# Altium footprint library Package_DFN_QFN.PcbLib: 557 footprints (part 21 of 35)
Each footprint in its own frame and in the unit in brackets; x right, y up, seen from the top. Pads: shape width x height; smd on the part's side, far side on the other; paste and mask are expansions set on the pad; w line width, h text height; cw(c..) or ccw(c..) is an arc to the next point about the centre after c.
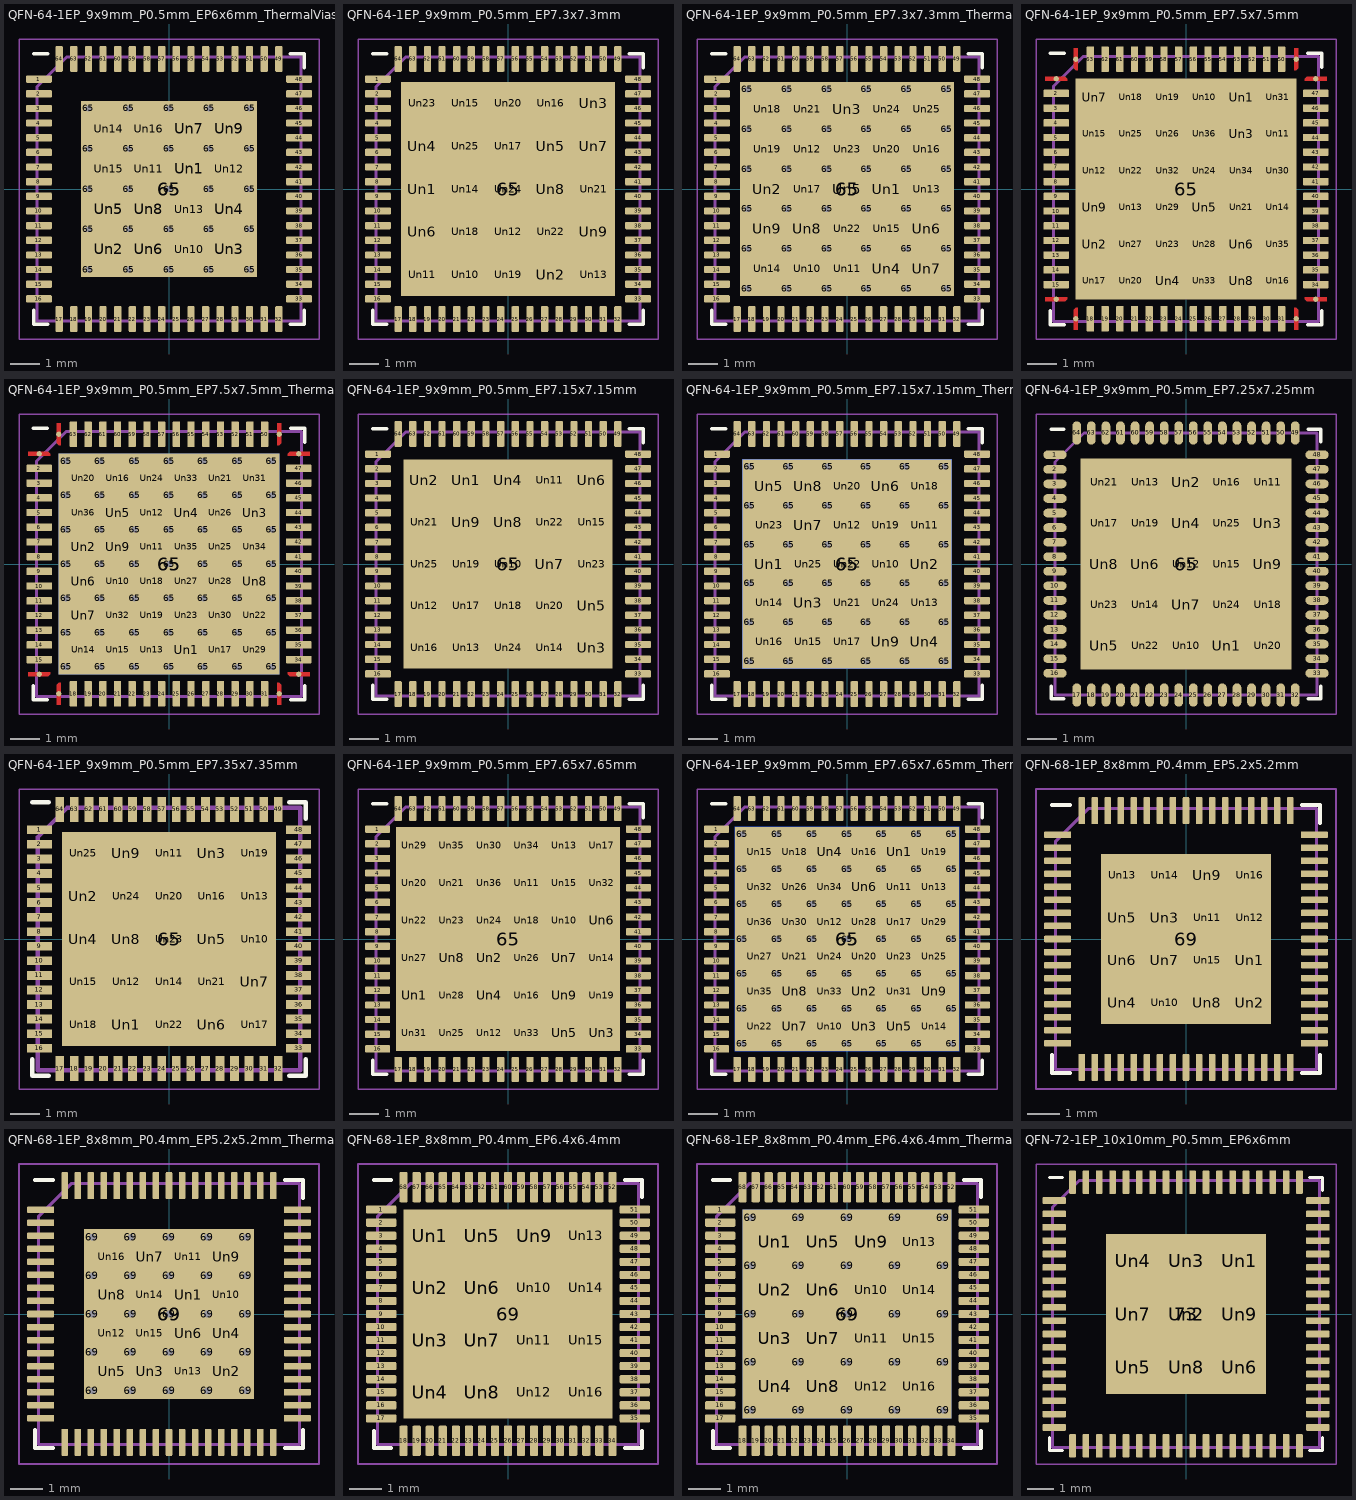
[diagram p20: the footprints below, top view; thin cyan lines are the x and y axes]

## QFN-64-1EP_9x9mm_P0.5mm_EP6x6mm_ThermalVias [mm]
pads (107):
  rrect25% 0.875x0.25 smd: 1(-4.437,3.75) 2(-4.437,3.25) 3(-4.437,2.75) 4(-4.437,2.25) 5(-4.437,1.75) 6(-4.437,1.25) 7(-4.437,0.75) 8(-4.437,0.25) 9(-4.437,-0.25) 10(-4.437,-0.75) 11(-4.437,-1.25) 12(-4.437,-1.75) 13(-4.437,-2.25) 14(-4.437,-2.75) 15(-4.437,-3.25) 16(-4.437,-3.75) 33(4.437,-3.75) 34(4.437,-3.25) 35(4.437,-2.75) 36(4.437,-2.25) 37(4.437,-1.75) 38(4.437,-1.25) 39(4.437,-0.75) 40(4.437,-0.25) 41(4.437,0.25) 42(4.437,0.75) 43(4.437,1.25) 44(4.437,1.75) 45(4.437,2.25) 46(4.437,2.75) 47(4.437,3.25) 48(4.437,3.75)
  rrect25% 0.25x0.875 smd: 17(-3.75,-4.437) 18(-3.25,-4.437) 19(-2.75,-4.437) 20(-2.25,-4.437) 21(-1.75,-4.437) 22(-1.25,-4.437) 23(-0.75,-4.437) 24(-0.25,-4.437) 25(0.25,-4.437) 26(0.75,-4.437) 27(1.25,-4.437) 28(1.75,-4.437) 29(2.25,-4.437) 30(2.75,-4.437) 31(3.25,-4.437) 32(3.75,-4.437) 49(3.75,4.437) 50(3.25,4.437) 51(2.75,4.437) 52(2.25,4.437) 53(1.75,4.437) 54(1.25,4.437) 55(0.75,4.437) 56(0.25,4.437) 57(-0.25,4.437) 58(-0.75,4.437) 59(-1.25,4.437) 60(-1.75,4.437) 61(-2.25,4.437) 62(-2.75,4.437) 63(-3.25,4.437) 64(-3.75,4.437)
  round 0.5 hole 0.2: 65(-2.75,-2.75) 65(-2.75,-1.375) 65(-2.75,0) 65(-2.75,1.375) 65(-2.75,2.75) 65(-1.375,-2.75) 65(-1.375,-1.375) 65(-1.375,0) 65(-1.375,1.375) 65(-1.375,2.75) 65(0,-2.75) 65(0,-1.375) 65(0,0) 65(0,1.375) 65(0,2.75) 65(1.375,-2.75) 65(1.375,-1.375) 65(1.375,0) 65(1.375,1.375) 65(1.375,2.75) 65(2.75,-2.75) 65(2.75,-1.375) 65(2.75,0) 65(2.75,1.375) 65(2.75,2.75)
  rect 6x6 smd far side: 65(0,0)
  rect 6x6 smd: 65(0,0)
  rrect21% 1.209x1.209 on Top Paste: Un1(0.687,0.687) Un2(-2.063,-2.063) Un3(2.063,-2.063) Un4(2.063,-0.687) Un5(-2.063,-0.687) Un6(-0.687,-2.063) Un7(0.687,2.063) Un8(-0.687,-0.687) Un9(2.063,2.063) Un10(0.687,-2.063) Un11(-0.687,0.687) Un12(2.063,0.687) Un13(0.687,-0.687) Un14(-2.063,2.063) Un15(-2.063,0.687) Un16(-0.687,2.063)
F.SilkS:
  lines w0.12: -4.61,-4.135 -4.61,-4.61 -4.135,-4.61 ; -4.61,4.61 -4.135,4.61 ; 4.135,-4.61 4.61,-4.61 4.61,-4.135 ; 4.135,4.61 4.61,4.61 4.61,4.135
F.CrtYd:
  lines w0.05: -5.12,-5.12 5.12,-5.12 5.12,5.12 -5.12,5.12 -5.12,-5.12
F.Fab:
  lines w0.1: -4.5,-4.5 -4.5,3.5 -3.5,4.5 4.5,4.5 4.5,-4.5 -4.5,-4.5
  text "'.Designator'" at -4.047,-0.84 h1

## QFN-64-1EP_9x9mm_P0.5mm_EP7.3x7.3mm [mm]
pads (90):
  rrect25% 0.875x0.25 smd: 1(-4.437,3.75) 2(-4.437,3.25) 3(-4.437,2.75) 4(-4.437,2.25) 5(-4.437,1.75) 6(-4.437,1.25) 7(-4.437,0.75) 8(-4.437,0.25) 9(-4.437,-0.25) 10(-4.437,-0.75) 11(-4.437,-1.25) 12(-4.437,-1.75) 13(-4.437,-2.25) 14(-4.437,-2.75) 15(-4.437,-3.25) 16(-4.437,-3.75) 33(4.437,-3.75) 34(4.437,-3.25) 35(4.437,-2.75) 36(4.437,-2.25) 37(4.437,-1.75) 38(4.437,-1.25) 39(4.437,-0.75) 40(4.437,-0.25) 41(4.437,0.25) 42(4.437,0.75) 43(4.437,1.25) 44(4.437,1.75) 45(4.437,2.25) 46(4.437,2.75) 47(4.437,3.25) 48(4.437,3.75)
  rrect25% 0.25x0.875 smd: 17(-3.75,-4.437) 18(-3.25,-4.437) 19(-2.75,-4.437) 20(-2.25,-4.437) 21(-1.75,-4.437) 22(-1.25,-4.437) 23(-0.75,-4.437) 24(-0.25,-4.437) 25(0.25,-4.437) 26(0.75,-4.437) 27(1.25,-4.437) 28(1.75,-4.437) 29(2.25,-4.437) 30(2.75,-4.437) 31(3.25,-4.437) 32(3.75,-4.437) 49(3.75,4.437) 50(3.25,4.437) 51(2.75,4.437) 52(2.25,4.437) 53(1.75,4.437) 54(1.25,4.437) 55(0.75,4.437) 56(0.25,4.437) 57(-0.25,4.437) 58(-0.75,4.437) 59(-1.25,4.437) 60(-1.75,4.437) 61(-2.25,4.437) 62(-2.75,4.437) 63(-3.25,4.437) 64(-3.75,4.437)
  rect 7.3x7.3 smd: 65(0,0)
  rrect21% 1.18x1.18 on Top Paste: Un1(-2.92,0) Un2(1.46,-2.92) Un3(2.92,2.92) Un4(-2.92,1.46) Un5(1.46,1.46) Un6(-2.92,-1.46) Un7(2.92,1.46) Un8(1.46,0) Un9(2.92,-1.46) Un10(-1.46,-2.92) Un11(-2.92,-2.92) Un12(0,-1.46) Un13(2.92,-2.92) Un14(-1.46,0) Un15(-1.46,2.92) Un16(1.46,2.92) Un17(0,1.46) Un18(-1.46,-1.46) Un19(0,-2.92) Un20(0,2.92) Un21(2.92,0) Un22(1.46,-1.46) Un23(-2.92,2.92) Un24(0,0) Un25(-1.46,1.46)
F.SilkS:
  lines w0.12: -4.61,-4.135 -4.61,-4.61 -4.135,-4.61 ; -4.61,4.61 -4.135,4.61 ; 4.135,-4.61 4.61,-4.61 4.61,-4.135 ; 4.135,4.61 4.61,4.61 4.61,4.135
F.CrtYd:
  lines w0.05: -5.12,-5.12 -5.12,5.12 5.12,5.12 5.12,-5.12 -5.12,-5.12
F.Fab:
  lines w0.1: -4.5,-4.5 -4.5,3.5 -3.5,4.5 4.5,4.5 4.5,-4.5 -4.5,-4.5
  text "'.Designator'" at -4.047,-0.84 h1

## QFN-64-1EP_9x9mm_P0.5mm_EP7.3x7.3mm_ThermalVias [mm]
pads (127):
  rrect25% 0.875x0.25 smd: 1(-4.437,3.75) 2(-4.437,3.25) 3(-4.437,2.75) 4(-4.437,2.25) 5(-4.437,1.75) 6(-4.437,1.25) 7(-4.437,0.75) 8(-4.437,0.25) 9(-4.437,-0.25) 10(-4.437,-0.75) 11(-4.437,-1.25) 12(-4.437,-1.75) 13(-4.437,-2.25) 14(-4.437,-2.75) 15(-4.437,-3.25) 16(-4.437,-3.75) 33(4.437,-3.75) 34(4.437,-3.25) 35(4.437,-2.75) 36(4.437,-2.25) 37(4.437,-1.75) 38(4.437,-1.25) 39(4.437,-0.75) 40(4.437,-0.25) 41(4.437,0.25) 42(4.437,0.75) 43(4.437,1.25) 44(4.437,1.75) 45(4.437,2.25) 46(4.437,2.75) 47(4.437,3.25) 48(4.437,3.75)
  rrect25% 0.25x0.875 smd: 17(-3.75,-4.437) 18(-3.25,-4.437) 19(-2.75,-4.437) 20(-2.25,-4.437) 21(-1.75,-4.437) 22(-1.25,-4.437) 23(-0.75,-4.437) 24(-0.25,-4.437) 25(0.25,-4.437) 26(0.75,-4.437) 27(1.25,-4.437) 28(1.75,-4.437) 29(2.25,-4.437) 30(2.75,-4.437) 31(3.25,-4.437) 32(3.75,-4.437) 49(3.75,4.437) 50(3.25,4.437) 51(2.75,4.437) 52(2.25,4.437) 53(1.75,4.437) 54(1.25,4.437) 55(0.75,4.437) 56(0.25,4.437) 57(-0.25,4.437) 58(-0.75,4.437) 59(-1.25,4.437) 60(-1.75,4.437) 61(-2.25,4.437) 62(-2.75,4.437) 63(-3.25,4.437) 64(-3.75,4.437)
  round 0.5 hole 0.2: 65(-3.4,-3.4) 65(-3.4,-2.04) 65(-3.4,-0.68) 65(-3.4,0.68) 65(-3.4,2.04) 65(-3.4,3.4) 65(-2.04,-3.4) 65(-2.04,-2.04) 65(-2.04,-0.68) 65(-2.04,0.68) 65(-2.04,2.04) 65(-2.04,3.4) 65(-0.68,-3.4) 65(-0.68,-2.04) 65(-0.68,-0.68) 65(-0.68,0.68) 65(-0.68,2.04) 65(-0.68,3.4) 65(0.68,-3.4) 65(0.68,-2.04) 65(0.68,-0.68) 65(0.68,0.68) 65(0.68,2.04) 65(0.68,3.4) 65(2.04,-3.4) 65(2.04,-2.04) 65(2.04,-0.68) 65(2.04,0.68) 65(2.04,2.04) 65(2.04,3.4) 65(3.4,-3.4) 65(3.4,-2.04) 65(3.4,-0.68) 65(3.4,0.68) 65(3.4,2.04) 65(3.4,3.4)
  rect 7.3x7.3 smd: 65(0,0)
  rect 7.3x7.3 smd far side: 65(0,0)
  rrect21% 1.177x1.177 on Top Paste: Un1(1.36,0) Un2(-2.72,0) Un3(0,2.72) Un4(1.36,-2.72) Un5(0,0) Un6(2.72,-1.36) Un7(2.72,-2.72) Un8(-1.36,-1.36) Un9(-2.72,-1.36) Un10(-1.36,-2.72) Un11(0,-2.72) Un12(-1.36,1.36) Un13(2.72,0) Un14(-2.72,-2.72) Un15(1.36,-1.36) Un16(2.72,1.36) Un17(-1.36,0) Un18(-2.72,2.72) Un19(-2.72,1.36) Un20(1.36,1.36) Un21(-1.36,2.72) Un22(0,-1.36) Un23(0,1.36) Un24(1.36,2.72) Un25(2.72,2.72)
F.SilkS:
  lines w0.12: -4.61,-4.135 -4.61,-4.61 -4.135,-4.61 ; -4.61,4.61 -4.135,4.61 ; 4.135,-4.61 4.61,-4.61 4.61,-4.135 ; 4.135,4.61 4.61,4.61 4.61,4.135
F.CrtYd:
  lines w0.05: -5.12,-5.12 5.12,-5.12 5.12,5.12 -5.12,5.12 -5.12,-5.12
F.Fab:
  lines w0.1: -4.5,-4.5 4.5,-4.5 4.5,4.5 -3.5,4.5 -4.5,3.5 -4.5,-4.5
  text "'.Designator'" at -4.047,-0.84 h1

## QFN-64-1EP_9x9mm_P0.5mm_EP7.5x7.5mm [mm]
pads (101):
  round 0.179 smd: 1(-4.413,3.75) 16(-4.413,-3.75) 17(-3.75,-4.413) 32(3.75,-4.413) 33(4.413,-3.75) 48(4.413,3.75) 49(3.75,4.413) 64(-3.75,4.413)
  rrect25% 0.875x0.25 smd: 2(-4.413,3.25) 3(-4.413,2.75) 4(-4.413,2.25) 5(-4.413,1.75) 6(-4.413,1.25) 7(-4.413,0.75) 8(-4.413,0.25) 9(-4.413,-0.25) 10(-4.413,-0.75) 11(-4.413,-1.25) 12(-4.413,-1.75) 13(-4.413,-2.25) 14(-4.413,-2.75) 15(-4.413,-3.25) 34(4.413,-3.25) 35(4.413,-2.75) 36(4.413,-2.25) 37(4.413,-1.75) 38(4.413,-1.25) 39(4.413,-0.75) 40(4.413,-0.25) 41(4.413,0.25) 42(4.413,0.75) 43(4.413,1.25) 44(4.413,1.75) 45(4.413,2.25) 46(4.413,2.75) 47(4.413,3.25)
  rrect25% 0.25x0.875 smd: 18(-3.25,-4.413) 19(-2.75,-4.413) 20(-2.25,-4.413) 21(-1.75,-4.413) 22(-1.25,-4.413) 23(-0.75,-4.413) 24(-0.25,-4.413) 25(0.25,-4.413) 26(0.75,-4.413) 27(1.25,-4.413) 28(1.75,-4.413) 29(2.25,-4.413) 30(2.75,-4.413) 31(3.25,-4.413) 50(3.25,4.413) 51(2.75,4.413) 52(2.25,4.413) 53(1.75,4.413) 54(1.25,4.413) 55(0.75,4.413) 56(0.25,4.413) 57(-0.25,4.413) 58(-0.75,4.413) 59(-1.25,4.413) 60(-1.75,4.413) 61(-2.25,4.413) 62(-2.75,4.413) 63(-3.25,4.413)
  rect 7.5x7.5 smd: 65(0,0)
  rrect25% 1.01x1.01 on Top Paste: Un1(1.875,3.125) Un2(-3.125,-1.875) Un3(1.875,1.875) Un4(-0.625,-3.125) Un5(0.625,-0.625) Un6(1.875,-1.875) Un7(-3.125,3.125) Un8(1.875,-3.125) Un9(-3.125,-0.625) Un10(0.625,3.125) Un11(3.125,1.875) Un12(-3.125,0.625) Un13(-1.875,-0.625) Un14(3.125,-0.625) Un15(-3.125,1.875) Un16(3.125,-3.125) Un17(-3.125,-3.125) Un18(-1.875,3.125) Un19(-0.625,3.125) Un20(-1.875,-3.125) Un21(1.875,-0.625) Un22(-1.875,0.625) Un23(-0.625,-1.875) Un24(0.625,0.625) Un25(-1.875,1.875) Un26(-0.625,1.875) Un27(-1.875,-1.875) Un28(0.625,-1.875) Un29(-0.625,-0.625) Un30(3.125,0.625) Un31(3.125,3.125) Un32(-0.625,0.625) Un33(0.625,-3.125) Un34(1.875,0.625) Un35(3.125,-1.875) Un36(0.625,1.875)
F.Cu:
  region: -4.038,3.749 -4.038,3.688 -4.788,3.688 -4.788,3.812 -4.101,3.812
  region: -4.038,-3.749 -4.101,-3.812 -4.788,-3.812 -4.788,-3.688 -4.038,-3.688
  region: -3.688,-4.788 -3.812,-4.788 -3.812,-4.101 -3.749,-4.038 -3.688,-4.038
  region: 3.812,-4.101 3.812,-4.788 3.688,-4.788 3.688,-4.038 3.749,-4.038
  region: 4.788,-3.812 4.101,-3.812 4.038,-3.749 4.038,-3.688 4.788,-3.688
  region: 4.788,3.688 4.038,3.688 4.038,3.749 4.101,3.812 4.788,3.812
  region: 3.812,4.101 3.749,4.038 3.688,4.038 3.688,4.788 3.812,4.788
  region: -3.688,4.038 -3.749,4.038 -3.812,4.101 -3.812,4.788 -3.688,4.788
F.SilkS:
  lines w0.12: -4.61,-4.135 -4.61,-4.61 -4.135,-4.61 ; -4.61,4.61 -4.135,4.61 ; 4.135,-4.61 4.61,-4.61 4.61,-4.135 ; 4.135,4.61 4.61,4.61 4.61,4.135
F.Paste:
  region: -4.038,3.749 -4.038,3.688 -4.788,3.688 -4.788,3.812 -4.101,3.812
  region: -4.038,-3.749 -4.101,-3.812 -4.788,-3.812 -4.788,-3.688 -4.038,-3.688
  region: -3.688,-4.788 -3.812,-4.788 -3.812,-4.101 -3.749,-4.038 -3.688,-4.038
  region: 3.812,-4.101 3.812,-4.788 3.688,-4.788 3.688,-4.038 3.749,-4.038
  region: 4.788,-3.812 4.101,-3.812 4.038,-3.749 4.038,-3.688 4.788,-3.688
  region: 4.788,3.688 4.038,3.688 4.038,3.749 4.101,3.812 4.788,3.812
  region: 3.812,4.101 3.749,4.038 3.688,4.038 3.688,4.788 3.812,4.788
  region: -3.688,4.038 -3.749,4.038 -3.812,4.101 -3.812,4.788 -3.688,4.788
F.Mask:
  region: -4.038,3.749 -4.038,3.688 -4.788,3.688 -4.788,3.812 -4.101,3.812
  region: -4.038,-3.749 -4.101,-3.812 -4.788,-3.812 -4.788,-3.688 -4.038,-3.688
  region: -3.688,-4.788 -3.812,-4.788 -3.812,-4.101 -3.749,-4.038 -3.688,-4.038
  region: 3.812,-4.101 3.812,-4.788 3.688,-4.788 3.688,-4.038 3.749,-4.038
  region: 4.788,-3.812 4.101,-3.812 4.038,-3.749 4.038,-3.688 4.788,-3.688
  region: 4.788,3.688 4.038,3.688 4.038,3.749 4.101,3.812 4.788,3.812
  region: 3.812,4.101 3.749,4.038 3.688,4.038 3.688,4.788 3.812,4.788
  region: -3.688,4.038 -3.749,4.038 -3.812,4.101 -3.812,4.788 -3.688,4.788
F.CrtYd:
  lines w0.05: -5.1,-5.1 5.1,-5.1 5.1,5.1 -5.1,5.1 -5.1,-5.1
F.Fab:
  lines w0.1: -4.5,-4.5 4.5,-4.5 4.5,4.5 -3.5,4.5 -4.5,3.5 -4.5,-4.5
  text "'.Designator'" at -4.047,-0.84 h1

## QFN-64-1EP_9x9mm_P0.5mm_EP7.5x7.5mm_ThermalVias [mm]
pads (151):
  round 0.179 smd: 1(-4.413,3.75) 16(-4.413,-3.75) 17(-3.75,-4.413) 32(3.75,-4.413) 33(4.413,-3.75) 48(4.413,3.75) 49(3.75,4.413) 64(-3.75,4.413)
  rrect25% 0.875x0.25 smd: 2(-4.413,3.25) 3(-4.413,2.75) 4(-4.413,2.25) 5(-4.413,1.75) 6(-4.413,1.25) 7(-4.413,0.75) 8(-4.413,0.25) 9(-4.413,-0.25) 10(-4.413,-0.75) 11(-4.413,-1.25) 12(-4.413,-1.75) 13(-4.413,-2.25) 14(-4.413,-2.75) 15(-4.413,-3.25) 34(4.413,-3.25) 35(4.413,-2.75) 36(4.413,-2.25) 37(4.413,-1.75) 38(4.413,-1.25) 39(4.413,-0.75) 40(4.413,-0.25) 41(4.413,0.25) 42(4.413,0.75) 43(4.413,1.25) 44(4.413,1.75) 45(4.413,2.25) 46(4.413,2.75) 47(4.413,3.25)
  rrect25% 0.25x0.875 smd: 18(-3.25,-4.413) 19(-2.75,-4.413) 20(-2.25,-4.413) 21(-1.75,-4.413) 22(-1.25,-4.413) 23(-0.75,-4.413) 24(-0.25,-4.413) 25(0.25,-4.413) 26(0.75,-4.413) 27(1.25,-4.413) 28(1.75,-4.413) 29(2.25,-4.413) 30(2.75,-4.413) 31(3.25,-4.413) 50(3.25,4.413) 51(2.75,4.413) 52(2.25,4.413) 53(1.75,4.413) 54(1.25,4.413) 55(0.75,4.413) 56(0.25,4.413) 57(-0.25,4.413) 58(-0.75,4.413) 59(-1.25,4.413) 60(-1.75,4.413) 61(-2.25,4.413) 62(-2.75,4.413) 63(-3.25,4.413)
  round 0.5 hole 0.2: 65(-3.5,-3.5) 65(-3.5,-2.333) 65(-3.5,-1.167) 65(-3.5,0) 65(-3.5,1.167) 65(-3.5,2.333) 65(-3.5,3.5) 65(-2.333,-3.5) 65(-2.333,-2.333) 65(-2.333,-1.167) 65(-2.333,0) 65(-2.333,1.167) 65(-2.333,2.333) 65(-2.333,3.5) 65(-1.167,-3.5) 65(-1.167,-2.333) 65(-1.167,-1.167) 65(-1.167,0) 65(-1.167,1.167) 65(-1.167,2.333) 65(-1.167,3.5) 65(0,-3.5) 65(0,-2.333) 65(0,-1.167) 65(0,0) 65(0,1.167) 65(0,2.333) 65(0,3.5) 65(1.167,-3.5) 65(1.167,-2.333) 65(1.167,-1.167) 65(1.167,0) 65(1.167,1.167) 65(1.167,2.333) 65(1.167,3.5) 65(2.333,-3.5) 65(2.333,-2.333) 65(2.333,-1.167) 65(2.333,0) 65(2.333,1.167) 65(2.333,2.333) 65(2.333,3.5) 65(3.5,-3.5) 65(3.5,-2.333) 65(3.5,-1.167) 65(3.5,0) 65(3.5,1.167) 65(3.5,2.333) 65(3.5,3.5)
  rect 7.5x7.5 smd: 65(0,0)
  rect 7.5x7.5 smd far side: 65(0,0)
  rrect25% 1.008x1.008 on Top Paste: Un1(0.583,-2.917) Un2(-2.917,0.583) Un3(2.917,1.75) Un4(0.583,1.75) Un5(-1.75,1.75) Un6(-2.917,-0.583) Un7(-2.917,-1.75) Un8(2.917,-0.583) Un9(-1.75,0.583) Un10(-1.75,-0.583) Un11(-0.583,0.583) Un12(-0.583,1.75) Un13(-0.583,-2.917) Un14(-2.917,-2.917) Un15(-1.75,-2.917) Un16(-1.75,2.917) Un17(1.75,-2.917) Un18(-0.583,-0.583) Un19(-0.583,-1.75) Un20(-2.917,2.917) Un21(1.75,2.917) Un22(2.917,-1.75) Un23(0.583,-1.75) Un24(-0.583,2.917) Un25(1.75,0.583) Un26(1.75,1.75) Un27(0.583,-0.583) Un28(1.75,-0.583) Un29(2.917,-2.917) Un30(1.75,-1.75) Un31(2.917,2.917) Un32(-1.75,-1.75) Un33(0.583,2.917) Un34(2.917,0.583) Un35(0.583,0.583) Un36(-2.917,1.75)
F.Cu:
  region: -4.038,3.749 -4.038,3.688 -4.788,3.688 -4.788,3.812 -4.101,3.812
  region: -4.038,-3.749 -4.101,-3.812 -4.788,-3.812 -4.788,-3.688 -4.038,-3.688
  region: -3.688,-4.788 -3.812,-4.788 -3.812,-4.101 -3.749,-4.038 -3.688,-4.038
  region: 3.812,-4.101 3.812,-4.788 3.688,-4.788 3.688,-4.038 3.749,-4.038
  region: 4.788,-3.812 4.101,-3.812 4.038,-3.749 4.038,-3.688 4.788,-3.688
  region: 4.788,3.688 4.038,3.688 4.038,3.749 4.101,3.812 4.788,3.812
  region: 3.812,4.101 3.749,4.038 3.688,4.038 3.688,4.788 3.812,4.788
  region: -3.688,4.038 -3.749,4.038 -3.812,4.101 -3.812,4.788 -3.688,4.788
F.SilkS:
  lines w0.12: -4.61,-4.135 -4.61,-4.61 -4.135,-4.61 ; -4.61,4.61 -4.135,4.61 ; 4.135,-4.61 4.61,-4.61 4.61,-4.135 ; 4.135,4.61 4.61,4.61 4.61,4.135
F.Paste:
  region: -4.038,3.749 -4.038,3.688 -4.788,3.688 -4.788,3.812 -4.101,3.812
  region: -4.038,-3.749 -4.101,-3.812 -4.788,-3.812 -4.788,-3.688 -4.038,-3.688
  region: -3.688,-4.788 -3.812,-4.788 -3.812,-4.101 -3.749,-4.038 -3.688,-4.038
  region: 3.812,-4.101 3.812,-4.788 3.688,-4.788 3.688,-4.038 3.749,-4.038
  region: 4.788,-3.812 4.101,-3.812 4.038,-3.749 4.038,-3.688 4.788,-3.688
  region: 4.788,3.688 4.038,3.688 4.038,3.749 4.101,3.812 4.788,3.812
  region: 3.812,4.101 3.749,4.038 3.688,4.038 3.688,4.788 3.812,4.788
  region: -3.688,4.038 -3.749,4.038 -3.812,4.101 -3.812,4.788 -3.688,4.788
F.Mask:
  region: -4.038,3.749 -4.038,3.688 -4.788,3.688 -4.788,3.812 -4.101,3.812
  region: -4.038,-3.749 -4.101,-3.812 -4.788,-3.812 -4.788,-3.688 -4.038,-3.688
  region: -3.688,-4.788 -3.812,-4.788 -3.812,-4.101 -3.749,-4.038 -3.688,-4.038
  region: 3.812,-4.101 3.812,-4.788 3.688,-4.788 3.688,-4.038 3.749,-4.038
  region: 4.788,-3.812 4.101,-3.812 4.038,-3.749 4.038,-3.688 4.788,-3.688
  region: 4.788,3.688 4.038,3.688 4.038,3.749 4.101,3.812 4.788,3.812
  region: 3.812,4.101 3.749,4.038 3.688,4.038 3.688,4.788 3.812,4.788
  region: -3.688,4.038 -3.749,4.038 -3.812,4.101 -3.812,4.788 -3.688,4.788
F.CrtYd:
  lines w0.05: -5.1,-5.1 -5.1,5.1 5.1,5.1 5.1,-5.1 -5.1,-5.1
F.Fab:
  lines w0.1: -4.5,-4.5 4.5,-4.5 4.5,4.5 -3.5,4.5 -4.5,3.5 -4.5,-4.5
  text "'.Designator'" at -4.047,-0.84 h1
